# Altium footprint library LituLib.PcbLib: 69 footprints (part 1 of 5)
Each footprint in its own frame and in the unit in brackets; x right, y up, seen from the top. Pads: shape width x height; smd on the part's side, far side on the other; paste and mask are expansions set on the pad; w line width, h text height; cw(c..) or ccw(c..) is an arc to the next point about the centre after c.
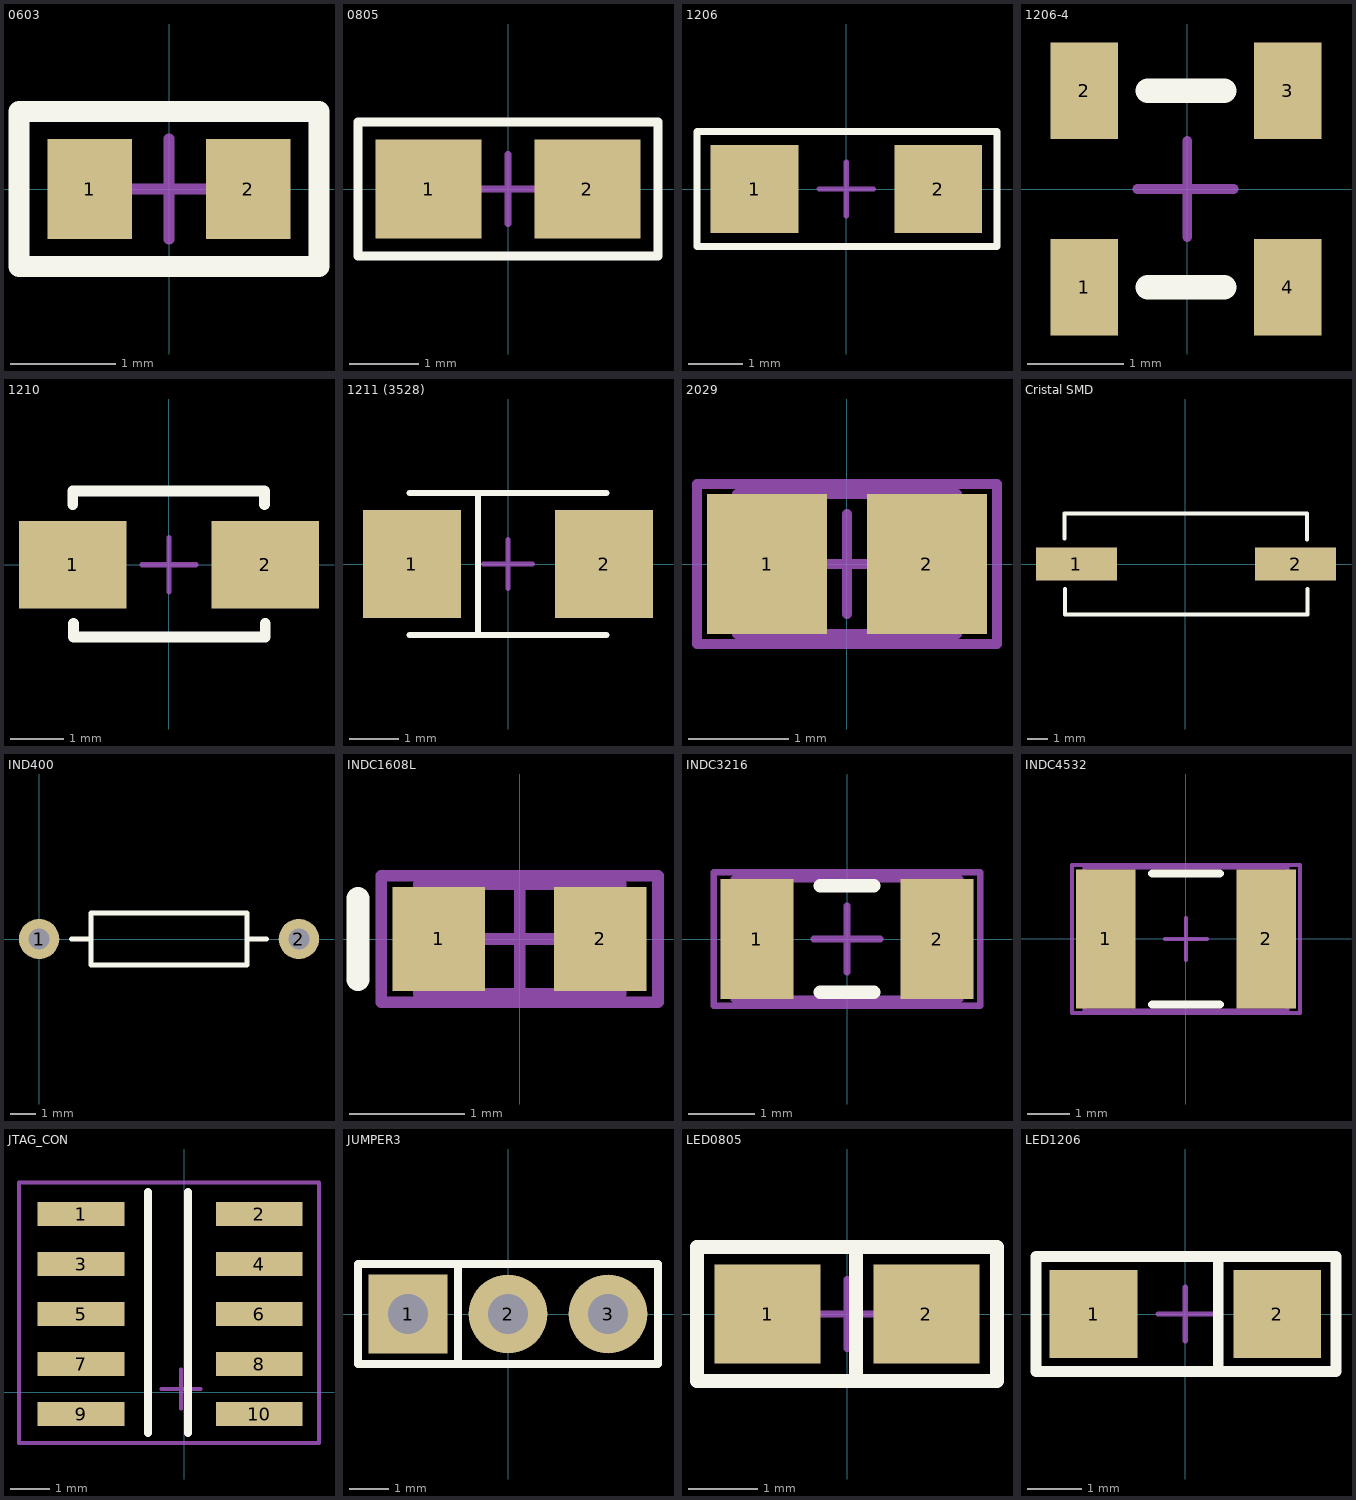
[diagram p0: the footprints below, top view; thin cyan lines are the x and y axes]

## 0603 [mm] "Pasivo 0603"
height 0.55
pads (2):
  rect 0.8x0.95 smd: 1(-0.75,0) 2(0.75,0)
Top Overlay:
  lines w0.2: -1.422,-0.737 -1.422,0.737 1.422,0.737 1.422,-0.737 -1.422,-0.737
Mechanical 15:
  lines w0.1: -0.475,0 0.475,0 ; 0,-0.475 0,0.475
3D body "0603.STEP": height 0.44, standoff -0.03, extent -0.8,-0.406 0.8,0.394

## 0805 [mil] "Pasivo 0805"
height 27.56
pads (2):
  rect 60x56 smd: 1(-45,0) 2(45,0)
Top Overlay:
  lines w5: -85,-38 -85,38 85,38 85,-38 -85,-38
Mechanical 15:
  lines w3.94: -19.69,0 19.68,0 ; 0,-19.68 0,19.68
3D body "0805.STEP": height 15.35, standoff -0.79, extent -39.5,-24.5 39.24,24.71

## 1206 [mil] "Pasivo 1206"
height 27.56
pads (2):
  rect 64x64 smd: 1(-67,0) 2(67,0)
Top Overlay:
  lines w5: -109,-42 110,-42 110,42 -109,42 -109,-42
Mechanical 15:
  lines w3.94: -19.68,0 19.69,0 ; 0,-19.68 0,19.69
3D body "1206.STEP": height 19.68, standoff -0.39, extent -62.5,-31.5 63.48,31.49

## 1206-4 [mm] "1206 4 pin"
height 0.7
pads (4):
  rect 0.7x1 smd: 1(-1.067,-1.016) 2(-1.067,1.016) 3(1.041,1.016) 4(1.041,-1.016)
Top Overlay:
  lines w0.254: -0.406,-1.016 0.381,-1.016 ; -0.406,1.016 0.381,1.016
Mechanical 15:
  lines w0.1: -0.517,0 0.483,0 ; 0,-0.5 0,0.5
3D body "User Library-Murata_DLP31S.STEP": height 1.15, standoff 0, extent -0.8,-1.6 0.8,1.6
3D body "User Library-DLP31S.STEP": height 0, standoff 0, extent 0,0 0,0
3D body "User Library-DLP31S.STEP": height 0, standoff 0, extent -1.092,1.067 -1.092,1.067

## 1210 [mm] "1210"
height 0.7
pads (2):
  rect 2x1.626 smd: 1(-1.79,0) 2(1.79,0)
Top Overlay:
  lines w0.2: -1.79,1.118 -1.79,1.372 1.778,1.372 1.778,1.118 ; -1.778,-1.092 -1.778,-1.346 1.79,-1.346 1.79,-1.092
Mechanical 15:
  lines w0.1: -0.5,0 0.5,0 ; 0,-0.5 0,0.5
3D body "User Library-3225.STEP": height -0.5, standoff -2.39, extent -1.6,-1.23 1.6,1.27

## 1211 (3528) [mm] "3528"
height 0.7
pads (2):
  rect 2x2.2 smd: 1(-1.956,0) 2(1.956,0)
Top Overlay:
  lines w0.127: -2.007,-1.448 2.007,-1.448 ; -2.007,1.448 2.007,1.448 ; -0.61,-1.372 -0.61,1.448
Mechanical 15:
  lines w0.1: -0.5,0 0.5,0 ; 0,-0.5 0,0.5
3D body "User Library-AVX_BCASE.step": height 2.03, standoff 0, extent -1.85,-1.465 1.85,1.465

## 2029 [mm] "Chip Inductor, Body 2.0x1.2mm, IPC High Density"
height 0.55
pads (2):
  rect 1.2x1.4 smd: 1(-0.8,0) 2(0.8,0)
Mechanical 13:
  lines w0.1: -1.1,-0.7 -1.1,0.7 1.1,0.7 1.1,-0.7 -1.1,-0.7
Mechanical 15:
  lines w0.1: -0.5,0 0.5,0 ; 0,-0.5 0,0.5 ; -1.5,-0.8 -1.5,0.8 1.5,0.8 1.5,-0.8 -1.5,-0.8
3D body: height 0.55, standoff 0, extent -1.1,-0.7 1.1,0.7

## Cristal SMD [mil]
pads (2):
  rect 157.48x64 smd: 1(-212,0) 2(214,0)
Top Overlay:
  lines w7.87: -235.22,49.22 -235.22,98.43 236,98.43 ; -234,-48.22 -234,-98.43 237.22,-98.43 237.22,-48.22 ; 236,47.57 236,97.78
3D body "User Library-Crystal HC49_US-SM.step": height 169.29, standoff 0, extent -250.97,-95.08 252.97,95.08

## IND400 [mil]
pads (2):
  round 62 hole 32: 1(0,0) 2(400,0)
Top Overlay:
  lines w7.87: 50,0 80,0 ; 320,0 350,0 ; 80,-40 320,-40 320,40 80,40 80,-40

## INDC1608L [mm] "Chip Inductor, Body 1.6x0.8mm, IPC High Density"
height 0.55
pads (2):
  rect 0.8x0.9 smd: 1(-0.7,0) 2(0.7,0)
Top Overlay:
  lines w0.2: -1.4,-0.35 -1.4,0.35
Mechanical 13:
  lines w0.1: -0.875,-0.475 -0.875,0.475 0.875,0.475 0.875,-0.475 -0.875,-0.475
Mechanical 15:
  lines w0.1: -0.475,0 0.475,0 ; 0,-0.475 0,0.475 ; -1.2,-0.55 -1.2,0.55 1.2,0.55 1.2,-0.55 -1.2,-0.55
3D body: height 0.55, standoff 0, extent -0.875,-0.475 0.875,0.475

## INDC3216 [mm] "Chip Inductor, Body 3.2x1.6mm, IPC High Density"
height 0.55
pads (2):
  rect 1.1x1.8 smd: 1(-1.35,0) 2(1.35,0)
Top Overlay:
  lines w0.2: -0.4,-0.8 0.4,-0.8 ; -0.4,0.8 0.4,0.8
Mechanical 13:
  lines w0.1: -1.7,-0.9 1.7,-0.9 1.7,0.9 -1.7,0.9 -1.7,-0.9
Mechanical 15:
  lines w0.1: -0.5,0 0.5,0 ; 0,-0.5 0,0.5 ; -2,-1 2,-1 2,1 -2,1 -2,-1
3D body: height 0.55, standoff 0, extent -1.7,-0.9 1.7,0.9

## INDC4532 [mm] "Chip Inductor, Body 4.5x3.2mm, IPC High Density"
height 0.55
pads (2):
  rect 1.4x3.3 smd: 1(-1.9,0) 2(1.9,0)
Top Overlay:
  lines w0.2: -0.8,-1.55 0.8,-1.55 ; -0.8,1.55 0.8,1.55
Mechanical 13:
  lines w0.1: -2.4,-1.7 -2.4,1.7 2.4,1.7 2.4,-1.7 -2.4,-1.7
Mechanical 15:
  lines w0.1: -0.5,0 0.5,0 ; 0,-0.5 0,0.5 ; -2.7,-1.75 -2.7,1.75 2.7,1.75 2.7,-1.75 -2.7,-1.75
3D body: height 0.55, standoff 0, extent -2.4,-1.7 2.4,1.7

## JTAG_CON [mm]
pads (10):
  rect 2.2x0.6 smd: 1(-2.616,4.521) 2(1.913,4.521) 3(-2.616,3.251) 4(1.913,3.251) 5(-2.616,1.981) 6(1.913,1.981) 7(-2.616,0.711) 8(1.913,0.711) 9(-2.616,-0.559) 10(1.913,-0.559)
Top Overlay:
  lines w0.2: -0.914,-1.041 -0.914,5.08 ; 0.102,-1.041 0.102,5.08
Mechanical 15:
  lines w0.1: -0.576,0.076 0.424,0.076 ; -0.076,-0.424 -0.076,0.576 ; -4.191,-1.295 3.429,-1.295 3.429,5.326 -4.191,5.326 -4.191,-1.295
3D body "User Library-RM127_10pin_Header.step": height 4.5, standoff 0, extent -3.156,-1.168 2.344,5.182

## JUMPER3 [mm]
pads (3):
  rect 2x2 hole 1.016: 1(-2.54,0)
  round 2 hole 1.016: 2(0,0) 3(2.54,0)
Top Overlay:
  lines w0.2: -1.27,-1.27 -1.27,1.27 ; -3.81,-1.27 3.81,-1.27 3.81,1.27 -3.81,1.27 -3.81,-1.27
3D body "User Library-Mini Jumper.step": height 16.15, standoff 2.65, extent -3.795,-1.12 1.255,1.27
3D body "SIP3.step": height 8.38, standoff -2.54, extent -3.81,-1.295 3.81,1.245

## LED0805 [mil] "LED SMD 0805"
height 27.56
pads (2):
  rect 60x56 smd: 1(-45,0) 2(45,0)
Top Overlay:
  lines w7.87: 5,-38 5,38 ; -85,-38 85,-38 85,38 -85,38 -85,-38
Mechanical 15:
  lines w3.94: -19.69,0 19.68,0 ; 0,-19.68 0,19.68
3D body "LED0805.step": height 33.45, standoff 0.23, extent -40.6,-17.68 40.6,18

## LED1206 [mil]
height 27.56
pads (2):
  rect 64x64 smd: 1(-67,0) 2(67,0)
Top Overlay:
  lines w7.87: 24,-42 24,42 ; -109,-42 110,-42 110,42 -109,42 -109,-42
Mechanical 15:
  lines w3.94: -19.68,0 19.69,0 ; 0,-19.68 0,19.69
3D body "LED1206R.STEP": height 43.81, standoff -15.9, extent -61,-31 65,32